# Altium footprint library DBLib.PcbLib: 99 footprints (part 5 of 7)
Each footprint in its own frame and in the unit in brackets; x right, y up, seen from the top. Pads: shape width x height; smd on the part's side, far side on the other; paste and mask are expansions set on the pad; w line width, h text height; cw(c..) or ccw(c..) is an arc to the next point about the centre after c.
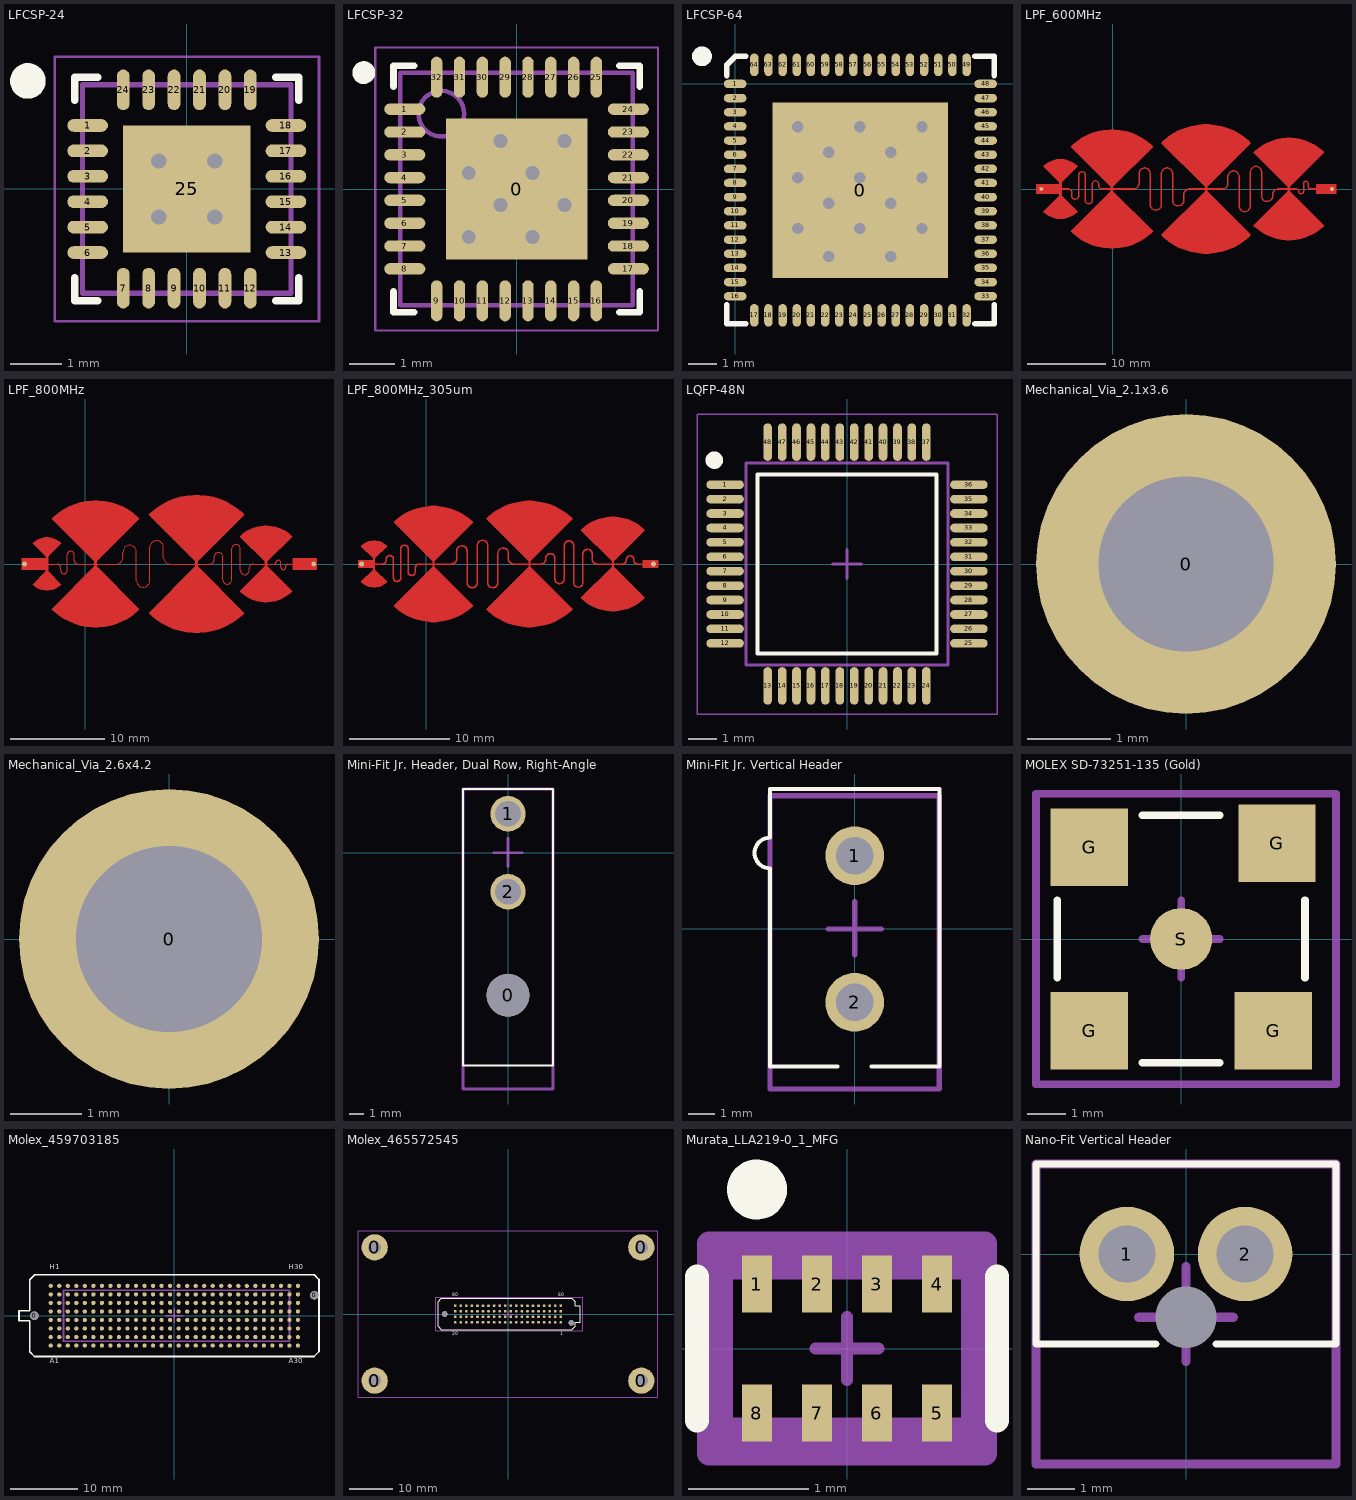
[diagram p4: the footprints below, top view; thin cyan lines are the x and y axes]

## LFCSP-24 [mm] "QFN, 24-Leads, Body 4,00x4,00mm, Pitch 0,50mm, Thermal Pad 2,50x2,50mm, IPC Medium Density"
height 0.8
pads (25):
  oval 0.8x0.25 smd: 1(-1.95,1.25) 2(-1.95,0.75) 3(-1.95,0.25) 4(-1.95,-0.25) 5(-1.95,-0.75) 6(-1.95,-1.25) 13(1.95,-1.25) 14(1.95,-0.75) 15(1.95,-0.25) 16(1.95,0.25) 17(1.95,0.75) 18(1.95,1.25)
  oval 0.25x0.8 smd: 7(-1.25,-1.95) 8(-0.75,-1.95) 9(-0.25,-1.95) 10(0.25,-1.95) 11(0.75,-1.95) 12(1.25,-1.95) 19(1.25,1.95) 20(0.75,1.95) 21(0.25,1.95) 22(-0.25,1.95) 23(-0.75,1.95) 24(-1.25,1.95)
  rect 2.5x2.5 all layers, no hole: 25(0,0)
via -0.55,-0.55 diameter 0.6 hole 0.3
via 0.55,-0.55 diameter 0.6 hole 0.3
via 0.55,0.55 diameter 0.6 hole 0.3
via -0.55,0.55 diameter 0.6 hole 0.3
Top Overlay:
  circle w0.35: c-3.125,2.125 r0.175
  lines w0.15: -2.2,-1.75 -2.2,-2.2 -1.75,-2.2 ; -2.2,1.75 -2.2,2.2 -1.75,2.2 ; 1.75,-2.2 2.2,-2.2 2.2,-1.75 ; 1.75,2.2 2.2,2.2 2.2,1.75
Mechanical 1:
  lines w0.05: -2.6,-2.6 2.6,-2.6 2.6,2.6 -2.6,2.6 -2.6,-2.6
  lines w0.1: -2.05,-2.05 2.05,-2.05 2.05,2.05 -2.05,2.05 -2.05,-2.05
Mechanical 15:
  lines w0.1: -0.5,0 0.5,0 ; 0,-0.5 0,0.5
3D body "User Library-LFCSP-24.step": height 0.83, standoff -0.02, extent -1.99,-2.01 2.01,1.99

## LFCSP-32 [mm] "LFCSP, 32-Leads, Body 5,00x5,00mm, Pitch 0,50mm"
height 1.35
pads (33):
  rect 3.1x3.1 all layers, no hole: 0(0,0)
  oval 0.9x0.25 smd: 1(-2.45,1.75) 2(-2.45,1.25) 3(-2.45,0.75) 4(-2.45,0.25) 5(-2.45,-0.25) 6(-2.45,-0.75) 7(-2.45,-1.25) 8(-2.45,-1.75) 17(2.45,-1.75) 18(2.45,-1.25) 19(2.45,-0.75) 20(2.45,-0.25) 21(2.45,0.25) 22(2.45,0.75) 23(2.45,1.25) 24(2.45,1.75)
  oval 0.25x0.9 smd: 9(-1.75,-2.45) 10(-1.25,-2.45) 11(-0.75,-2.45) 12(-0.25,-2.45) 13(0.25,-2.45) 14(0.75,-2.45) 15(1.25,-2.45) 16(1.75,-2.45) 25(1.75,2.45) 26(1.25,2.45) 27(0.75,2.45) 28(0.25,2.45) 29(-0.25,2.45) 30(-0.75,2.45) 31(-1.25,2.45) 32(-1.75,2.45)
via -1.05,-1.05 diameter 0.6 hole 0.3
via -0.35,1.05 diameter 0.6 hole 0.3
via 1.05,1.05 diameter 0.6 hole 0.3
via 0.35,0.35 diameter 0.6 hole 0.3
via -0.35,-0.35 diameter 0.6 hole 0.3
via 1.05,-0.35 diameter 0.6 hole 0.3
via 0.35,-1.05 diameter 0.6 hole 0.3
via -1.05,0.35 diameter 0.6 hole 0.3
Top Overlay:
  circle w0.25: c-3.35,2.55 r0.125
  lines w0.15: -2.7,-2.25 -2.7,-2.7 -2.25,-2.7 ; -2.7,2.25 -2.7,2.7 -2.25,2.7 ; 2.25,-2.7 2.7,-2.7 2.7,-2.25 ; 2.25,2.7 2.7,2.7 2.7,2.25
Mechanical 1:
  circle w0.1: c-1.65,1.65 r0.5
  lines w0.05: -3.1,-3.1 3.1,-3.1 3.1,3.1 -3.1,3.1 -3.1,-3.1
  lines w0.1: -0.5,0 0.5,0 ; 0,-0.5 0,0.5 ; -2.55,-2.55 2.55,-2.55 2.55,2.55 -2.55,2.55 -2.55,-2.55

## LFCSP-64 [mm]
height 1
pads (65):
  rect 6.2x6.2 all layers, no hole: 0(4.425,-3.75)
  oval 0.8x0.3 smd: 1(0,0) 2(0,-0.5) 3(0,-1) 4(0,-1.5) 5(0,-2) 6(0,-2.5) 7(0,-3) 8(0,-3.5) 9(0,-4) 10(0,-4.5) 11(0,-5) 12(0,-5.5) 13(0,-6) 14(0,-6.5) 15(0,-7) 16(0,-7.5) 33(8.85,-7.5) 34(8.85,-7) 35(8.85,-6.5) 36(8.85,-6) 37(8.85,-5.5) 38(8.85,-5) 39(8.85,-4.5) 40(8.85,-4) 41(8.85,-3.5) 42(8.85,-3) 43(8.85,-2.5) 44(8.85,-2) 45(8.85,-1.5) 46(8.85,-1) 47(8.85,-0.5) 48(8.85,0)
  oval 0.3x0.8 smd: 17(0.675,-8.175) 18(1.175,-8.175) 19(1.675,-8.175) 20(2.175,-8.175) 21(2.675,-8.175) 22(3.175,-8.175) 23(3.675,-8.175) 24(4.175,-8.175) 25(4.675,-8.175) 26(5.175,-8.175) 27(5.675,-8.175) 28(6.175,-8.175) 29(6.675,-8.175) 30(7.175,-8.175) 31(7.675,-8.175) 32(8.175,-8.175) 49(8.175,0.675) 50(7.675,0.675) 51(7.175,0.675) 52(6.675,0.675) 53(6.175,0.675) 54(5.675,0.675) 55(5.175,0.675) 56(4.675,0.675) 57(4.175,0.675) 58(3.675,0.675) 59(3.175,0.675) 60(2.675,0.675) 61(2.175,0.675) 62(1.675,0.675) 63(1.175,0.675) 64(0.675,0.675)
via 2.211,-5.111 diameter 0.7 hole 0.4
via 4.4,-1.511 diameter 0.7 hole 0.4
via 6.6,-1.511 diameter 0.7 hole 0.4
via 3.3,-2.411 diameter 0.7 hole 0.4
via 5.5,-2.411 diameter 0.7 hole 0.4
via 4.4,-3.311 diameter 0.7 hole 0.4
via 6.6,-3.311 diameter 0.7 hole 0.4
via 3.3,-4.211 diameter 0.7 hole 0.4
via 5.5,-4.211 diameter 0.7 hole 0.4
via 4.4,-5.111 diameter 0.7 hole 0.4
via 6.6,-5.111 diameter 0.7 hole 0.4
via 2.211,-3.311 diameter 0.7 hole 0.4
via 2.211,-1.511 diameter 0.7 hole 0.4
via 5.5,-6.1 diameter 0.7 hole 0.4
via 3.3,-6.1 diameter 0.7 hole 0.4
Top Overlay:
  circle w0.35: c-1.175,0.975 r0.175
  lines w0.2: -0.3,-7.8 -0.3,-8.475 0.375,-8.475 ; -0.3,0.3 -0.3,0.675 0,0.975 0.375,0.975 ; 8.475,-8.475 9.15,-8.475 9.15,-7.8 ; 8.475,0.975 9.15,0.975 9.15,0.3
Top Paste:
  rectangle: 4.6,-6.5 7.1,-3.9
  rectangle: 4.6,-3.6 7.1,-1
  rectangle: 1.7,-3.6 4.3,-1
  rectangle: 1.7,-6.5 4.3,-3.9
3D body "User Library-LFCSP-64 AD9984AKCPZ-170.step": height 0.82, standoff -0.05, extent -0.075,-8.25 8.925,0.75

## LPF_600MHz [mm] "stripline LPF"
pads (2):
  round 0.5 smd: IN(-9.144,0) OUT(27.94,0)
Top Layer:
  region: 25.93,-0.59 25.93,0.59 28.47,0.59 28.47,-0.59
  region: -9.826,-0.59 -6.826,-0.59 -6.826,0.59 -9.826,0.59
  region: 22.337,0.263 17.937,4.663 18.16,4.885 18.646,5.284 19.169,5.634 19.724,5.93 20.305,6.171 20.906,6.353 21.523,6.476 22.149,6.538 22.464,6.538 22.778,6.538 23.404,6.476 24.021,6.353 24.623,6.171 25.204,5.93 25.759,5.634 26.282,5.284 26.768,4.885 26.99,4.663 22.591,0.263
  region: 17.937,-4.663 18.16,-4.885 18.646,-5.284 19.169,-5.634 19.724,-5.93 20.305,-6.171 20.906,-6.353 21.523,-6.476 22.149,-6.538 22.464,-6.538 22.778,-6.538 23.404,-6.476 24.021,-6.353 24.623,-6.171 25.204,-5.93 25.759,-5.634 26.282,-5.284 26.768,-4.885 26.99,-4.663 22.591,-0.263 22.337,-0.263
  region: 6.151,-5.871 6.432,-6.152 7.048,-6.658 7.711,-7.1 8.414,-7.476 9.15,-7.781 9.912,-8.012 10.694,-8.168 11.487,-8.246 11.885,-8.246 12.283,-8.246 13.076,-8.168 13.858,-8.012 14.62,-7.781 15.356,-7.476 16.059,-7.1 16.721,-6.658 17.337,-6.152 17.619,-5.871 12.012,-0.263 11.758,-0.263
  region: 11.758,0.263 6.151,5.871 6.432,6.152 7.048,6.658 7.711,7.1 8.414,7.476 9.15,7.781 9.912,8.012 10.694,8.168 11.487,8.246 11.885,8.246 12.283,8.246 13.076,8.168 13.858,8.012 14.62,7.781 15.356,7.476 16.059,7.1 16.721,6.658 17.337,6.152 17.619,5.871 12.012,0.263
  region: -8.917,-2.882 -8.808,-2.991 -8.57,-3.187 -8.314,-3.358 -8.042,-3.503 -7.757,-3.621 -7.462,-3.711 -7.16,-3.771 -6.853,-3.801 -6.699,-3.801 -6.545,-3.801 -6.238,-3.771 -5.936,-3.711 -5.641,-3.621 -5.356,-3.503 -5.084,-3.358 -4.827,-3.187 -4.589,-2.991 -4.48,-2.882 -6.572,-0.79 -6.826,-0.79
  region: -6.826,0.79 -8.917,2.882 -8.808,2.991 -8.57,3.187 -8.314,3.358 -8.042,3.503 -7.757,3.621 -7.462,3.711 -7.16,3.771 -6.853,3.801 -6.699,3.801 -6.545,3.801 -6.238,3.771 -5.936,3.711 -5.641,3.621 -5.356,3.503 -5.084,3.358 -4.827,3.187 -4.589,2.991 -4.48,2.882 -6.572,0.79
  region: -5.395,-5.397 -5.136,-5.656 -4.571,-6.12 -3.963,-6.526 -3.319,-6.87 -2.643,-7.15 -1.944,-7.362 -1.227,-7.505 -0.499,-7.577 -0.134,-7.577 0.232,-7.577 0.959,-7.505 1.676,-7.362 2.376,-7.15 3.051,-6.87 3.696,-6.526 4.304,-6.12 4.869,-5.656 5.127,-5.397 -0.007,-0.263 -0.261,-0.263
  region: -0.261,0.263 -5.395,5.397 -5.136,5.656 -4.571,6.12 -3.963,6.526 -3.319,6.87 -2.643,7.15 -1.944,7.362 -1.227,7.505 -0.499,7.577 -0.134,7.577 0.232,7.577 0.959,7.505 1.676,7.362 2.376,7.15 3.051,6.87 3.696,6.526 4.304,6.12 4.869,5.656 5.127,5.397 -0.007,0.263
  region: 22.337,-0.27 22.335,-0.27 22.333,-0.269 22.331,-0.267 22.33,-0.265 22.33,-0.263 22.33,0.263 22.33,0.265 22.331,0.267 22.333,0.269 22.335,0.27 22.337,0.27 22.591,0.27 22.592,0.27 22.595,0.269 22.596,0.267 22.597,0.265 22.597,0.263 22.597,-0.263 22.597,-0.265 22.596,-0.267 22.595,-0.269 22.592,-0.27 22.591,-0.27
  region: -6.826,-0.797 -6.827,-0.797 -6.83,-0.796 -6.831,-0.794 -6.833,-0.792 -6.833,-0.79 -6.833,0.79 -6.833,0.792 -6.831,0.794 -6.83,0.796 -6.827,0.797 -6.826,0.797 -6.572,0.797 -6.57,0.797 -6.568,0.796 -6.566,0.794 -6.565,0.792 -6.565,0.79 -6.565,-0.79 -6.565,-0.792 -6.566,-0.794 -6.568,-0.796 -6.57,-0.797 -6.572,-0.797
  region: -0.261,-0.27 -0.262,-0.27 -0.265,-0.269 -0.266,-0.267 -0.267,-0.265 -0.267,-0.263 -0.267,0.263 -0.267,0.265 -0.266,0.267 -0.265,0.269 -0.262,0.27 -0.261,0.27 -0.007,0.27 -0.005,0.27 -0.003,0.269 -0.001,0.267 0,0.265 0,0.263 0,-0.263 0,-0.265 -0.001,-0.267 -0.003,-0.269 -0.005,-0.27 -0.007,-0.27
  region: 11.758,-0.27 11.757,-0.27 11.754,-0.269 11.752,-0.267 11.751,-0.265 11.751,-0.263 11.751,0.263 11.751,0.265 11.752,0.267 11.754,0.269 11.757,0.27 11.758,0.27 12.012,0.27 12.013,0.27 12.016,0.269 12.018,0.267 12.019,0.265 12.019,0.263 12.019,-0.263 12.019,-0.265 12.018,-0.267 12.016,-0.269 12.013,-0.27 12.012,-0.27
  region: 191 vertices and 0 holes, not listed, extent -0.064,-2.757 11.815,2.757
  region: 191 vertices and 0 holes, not listed, extent 11.955,-2.954 22.394,2.954
  region: 151 vertices and 0 holes, not listed, extent -6.629,-1.964 -0.204,2.262
  region: 24.009,-0.677 23.934,-0.677 23.795,-0.62 23.689,-0.514 23.631,-0.375 23.631,-0.3 23.627,-0.254 23.592,-0.169 23.526,-0.104 23.441,-0.068 23.395,-0.064 22.597,-0.064 22.571,-0.064 22.534,-0.026 22.534,0.026 22.571,0.064 22.597,0.064 23.395,0.064 23.468,0.064 23.601,0.009 23.704,-0.094 23.759,-0.228 23.759,-0.3 23.764,-0.349 23.801,-0.439 23.87,-0.507 23.96,-0.545 24.009,-0.549 24.057,-0.545 24.147,-0.507 24.216,-0.439 24.254,-0.349 24.258,-0.3 24.258,0.658 24.258,0.733 24.316,0.871 24.422,0.978 24.561,1.035 24.636,1.035 24.711,1.035 24.849,0.978 24.956,0.871 25.013,0.733 25.013,0.658 25.013,0.313 25.018,0.265 25.055,0.175 25.124,0.106 25.214,0.069 25.263,0.064 25.93,0.064 25.942,0.064 25.966,0.054 25.984,0.036 25.994,0.013 25.994,0 25.994,-0.013 25.984,-0.036 25.966,-0.054 25.942,-0.064 25.93,-0.064 25.263,-0.064 25.188,-0.064 25.049,-0.006 24.943,0.1 24.885,0.238 24.885,0.313 24.885,0.658 24.881,0.706 24.843,0.796 24.774,0.865 24.684,0.903 24.636,0.907 24.587,0.903 24.497,0.865 24.428,0.796 24.391,0.706 24.386,0.658 24.386,-0.3 24.386,-0.375 24.329,-0.514 24.222,-0.62 24.084,-0.677
Top Solder:
  region: -8.89,8.89 27.305,8.89 27.431,8.89 27.665,8.793 27.843,8.615 27.94,8.381 27.94,8.255 27.94,-8.255 27.94,-8.381 27.843,-8.615 27.665,-8.793 27.431,-8.89 27.305,-8.89 -8.89,-8.89 -9.016,-8.89 -9.25,-8.793 -9.428,-8.615 -9.525,-8.381 -9.525,-8.255 -9.525,8.255 -9.525,8.381 -9.428,8.615 -9.25,8.793 -9.016,8.89

## LPF_800MHz [mm] "stripline LPF"
pads (2):
  round 0.5 smd: IN(-6.4,0) OUT(24.2,0)
Top Layer:
  region: 0.995,0.268 -3.524,4.787 -3.296,5.015 -2.797,5.425 -2.26,5.783 -1.691,6.088 -1.094,6.335 -0.476,6.522 0.157,6.648 0.799,6.711 1.122,6.711 1.445,6.711 2.087,6.648 2.72,6.522 3.338,6.335 3.934,6.088 4.504,5.783 5.04,5.425 5.539,5.015 5.767,4.787 1.249,0.268
  region: -5.543,-2.17 -5.394,-2.319 -5.044,-2.552 -4.655,-2.714 -4.242,-2.796 -4.032,-2.796 -3.822,-2.796 -3.409,-2.714 -3.02,-2.552 -2.67,-2.319 -2.521,-2.17 -3.905,-0.786 -4.159,-0.786
  region: -4.159,0.795 -5.543,2.18 -5.394,2.328 -5.044,2.562 -4.655,2.723 -4.242,2.806 -4.032,2.806 -3.822,2.806 -3.409,2.723 -3.02,2.562 -2.67,2.328 -2.521,2.18 -3.905,0.795
  region: -4.159,-0.786 -3.905,-0.786 -3.905,0.795 -4.159,0.795
  region: -6.699,-0.586 -6.699,0.595 -4.159,0.595 -4.159,-0.586
  region: 0.995,-0.259 0.995,0.268 1.249,0.268 1.249,-0.259
  region: -3.524,-4.777 -3.296,-5.005 -2.797,-5.415 -2.26,-5.774 -1.691,-6.078 -1.094,-6.325 -0.476,-6.512 0.157,-6.638 0.799,-6.702 1.122,-6.702 1.445,-6.702 2.087,-6.638 2.72,-6.512 3.338,-6.325 3.934,-6.078 4.504,-5.774 5.04,-5.415 5.539,-5.005 5.767,-4.777 1.249,-0.259 0.995,-0.259
  region: 6.756,5.203 11.69,0.268 11.944,0.268 16.879,5.203 16.63,5.452 16.086,5.898 15.502,6.288 14.881,6.62 14.232,6.889 13.559,7.093 12.869,7.23 12.169,7.299 11.817,7.299 11.466,7.299 10.766,7.23 10.076,7.093 9.403,6.889 8.753,6.62 8.133,6.288 7.548,5.898 7.004,5.452
  region: 11.69,-0.259 11.944,-0.259 11.944,0.268 11.69,0.268
  region: 6.756,-5.193 7.004,-5.442 7.548,-5.888 8.133,-6.279 8.753,-6.61 9.403,-6.879 10.076,-7.083 10.766,-7.221 11.466,-7.29 11.817,-7.29 12.169,-7.29 12.869,-7.221 13.559,-7.083 14.232,-6.879 14.881,-6.61 15.502,-6.279 16.086,-5.888 16.63,-5.442 16.879,-5.193 11.944,-0.259 11.69,-0.259
  region: 16.393,2.906 19.03,0.268 19.284,0.268 21.922,2.906 21.786,3.042 21.489,3.286 21.17,3.499 20.831,3.68 20.476,3.827 20.109,3.939 19.732,4.014 19.349,4.051 19.157,4.051 18.965,4.051 18.583,4.014 18.206,3.939 17.839,3.827 17.484,3.68 17.145,3.499 16.825,3.286 16.528,3.042
  region: 19.03,-0.259 19.284,-0.259 19.284,0.268 19.03,0.268
  region: 16.393,-2.896 16.528,-3.032 16.825,-3.276 17.145,-3.489 17.484,-3.67 17.839,-3.818 18.206,-3.929 18.583,-4.004 18.965,-4.042 19.157,-4.042 19.349,-4.042 19.732,-4.004 20.109,-3.929 20.476,-3.818 20.831,-3.67 21.17,-3.489 21.489,-3.276 21.786,-3.032 21.922,-2.896 19.284,-0.259 19.03,-0.259
  region: 21.992,-0.586 24.532,-0.586 24.532,0.595 21.992,0.595
  lines w0.013: -3.905,-0.059 -3.905,0.068 ; 0.995,-0.059 0.995,0.068 ; 1.249,-0.059 1.249,0.068 ; 11.69,-0.059 11.69,0.068 ; 11.944,-0.059 11.944,0.068
  lines w0.127: -3.912,0 -3.683,0 -3.32,0 -2.956,0 cw(c-2.956,-0.363) -2.593,-0.363 -2.593,-0.674 ccw(c-2.229,-0.674) -2.229,-1.038 ccw(c-2.229,-0.674) -1.866,-0.674 -1.866,0 -1.866,0.978 cw(c-1.502,0.978) -1.502,1.342 cw(c-1.502,0.978) -1.139,0.978 -1.139,0.363 ccw(c-0.775,0.363) -0.775,0 0,0 0.991,0 ; 1.245,0 3.302,0 ccw(c3.302,0.713) 4.015,0.713 4.015,1.254 cw(c4.729,1.254) 4.729,1.968 cw(c4.729,1.254) 5.442,1.254 5.442,0 5.442,-1.749 ccw(c6.156,-1.749) 6.156,-2.462 ccw(c6.156,-1.749) 6.869,-1.749 6.869,0 6.869,1.749 cw(c7.583,1.749) 7.583,2.462 cw(c7.583,1.749) 8.296,1.749 8.296,0.713 ccw(c9.01,0.713) 9.01,0 10.287,0 11.69,0 ; 11.944,0 13.208,0 ccw(c13.208,0.463) 13.671,0.463 13.671,0.743 cw(c14.135,0.743) 14.135,1.206 cw(c14.135,0.743) 14.598,0.743 14.598,0 14.598,-1.66 ccw(c15.062,-1.66) 15.062,-2.123 ccw(c15.062,-1.66) 15.525,-1.66 15.525,0 15.525,1.593 cw(c15.989,1.593) 15.989,2.057 cw(c15.989,1.593) 16.452,1.593 16.452,0 16.452,-0.657 ccw(c16.916,-0.657) 16.916,-1.12 ccw(c16.916,-0.657) 17.379,-0.657 17.379,-0.463 cw(c17.843,-0.463) 17.843,0 18.288,0 19.03,0 ; 19.284,0 19.939,0 20.072,0 ccw(c20.072,0.13) 20.202,0.13 cw(c20.466,0.13) 20.466,0.394 cw(c20.466,0.13) 20.729,0.13 20.729,0 20.729,-0.337 ccw(c20.993,-0.337) 20.993,-0.601 ccw(c20.993,-0.337) 21.256,-0.337 21.256,-0.263 cw(c21.52,-0.263) 21.52,0 21.692,0 21.996,0
Top Solder:
  region: -6.35,8.255 24.13,8.255 24.256,8.255 24.49,8.158 24.668,7.98 24.765,7.746 24.765,7.62 24.765,-7.62 24.765,-7.746 24.668,-7.98 24.49,-8.158 24.256,-8.255 24.13,-8.255 -6.35,-8.255 -6.476,-8.255 -6.71,-8.158 -6.888,-7.98 -6.985,-7.746 -6.985,-7.62 -6.985,7.62 -6.985,7.746 -6.888,7.98 -6.71,8.158 -6.476,8.255

## LPF_800MHz_305um [mm] "stripline LPF"
pads (2):
  round 0.5 smd: IN(-6.4,0) OUT(22.606,0)
Top Layer:
  region: 21.528,-0.355 21.528,0.355 23.053,0.355 23.053,-0.355
  region: 15.379,3.369 18.486,0.262 18.638,0.262 21.745,3.369 21.588,3.525 21.247,3.806 20.879,4.052 20.489,4.26 20.08,4.429 19.657,4.558 19.223,4.644 18.783,4.687 18.562,4.687 18.341,4.687 17.901,4.644 17.467,4.558 17.044,4.429 16.635,4.26 16.245,4.052 15.878,3.806 15.536,3.525
  region: 15.379,-3.369 15.536,-3.525 15.878,-3.806 16.245,-4.052 16.635,-4.26 17.044,-4.429 17.467,-4.558 17.901,-4.644 18.341,-4.687 18.562,-4.687 18.783,-4.687 19.223,-4.644 19.657,-4.558 20.08,-4.429 20.489,-4.26 20.879,-4.052 21.247,-3.806 21.588,-3.525 21.745,-3.369 18.638,-0.262 18.486,-0.262
  region: 18.486,-0.262 18.486,0.262 18.638,0.262 18.638,-0.262
  region: 5.977,-4.487 6.188,-4.698 6.65,-5.077 7.147,-5.409 7.674,-5.691 8.226,-5.92 8.798,-6.093 9.384,-6.21 9.979,-6.268 10.278,-6.268 10.576,-6.268 11.171,-6.21 11.757,-6.093 12.329,-5.92 12.881,-5.691 13.408,-5.409 13.905,-5.077 14.367,-4.698 14.578,-4.487 10.354,-0.262 10.201,-0.262
  region: 5.977,4.487 10.201,0.262 10.354,0.262 14.578,4.487 14.367,4.698 13.905,5.077 13.408,5.409 12.881,5.691 12.329,5.92 11.757,6.093 11.171,6.21 10.576,6.268 10.278,6.268 9.979,6.268 9.384,6.21 8.798,6.093 8.226,5.92 7.674,5.691 7.147,5.409 6.65,5.077 6.188,4.698
  region: 10.201,-0.262 10.354,-0.262 10.354,0.262 10.201,0.262
  region: 0.658,0.262 -3.212,4.133 -3.018,4.326 -2.594,4.674 -2.138,4.979 -1.655,5.237 -1.148,5.447 -0.623,5.607 -0.086,5.714 0.46,5.767 0.734,5.767 1.008,5.767 1.554,5.714 2.092,5.607 2.617,5.447 3.123,5.237 3.607,4.979 4.063,4.674 4.487,4.326 4.681,4.133 0.811,0.262
  region: -3.212,-4.133 -3.018,-4.326 -2.594,-4.674 -2.138,-4.979 -1.655,-5.237 -1.148,-5.447 -0.623,-5.607 -0.086,-5.714 0.46,-5.767 0.734,-5.767 1.008,-5.767 1.554,-5.714 2.092,-5.607 2.617,-5.447 3.123,-5.237 3.607,-4.979 4.063,-4.674 4.487,-4.326 4.681,-4.133 0.811,-0.262 0.658,-0.262
  region: 0.658,-0.262 0.658,0.262 0.811,0.262 0.811,-0.262
  region: -6.459,-1.782 -6.331,-1.911 -6.029,-2.112 -5.694,-2.251 -5.338,-2.322 -5.156,-2.322 -4.975,-2.322 -4.619,-2.251 -4.283,-2.112 -3.981,-1.911 -3.853,-1.782 -5.08,-0.555 -5.232,-0.555
  region: -5.232,0.555 -6.459,1.782 -6.331,1.911 -6.029,2.112 -5.694,2.251 -5.338,2.322 -5.156,2.322 -4.975,2.322 -4.619,2.251 -4.283,2.112 -3.981,1.911 -3.853,1.782 -5.08,0.555
  region: -5.232,-0.562 -5.234,-0.562 -5.236,-0.561 -5.238,-0.559 -5.239,-0.557 -5.239,-0.555 -5.239,0.555 -5.239,0.557 -5.238,0.559 -5.236,0.561 -5.234,0.562 -5.232,0.562 -5.08,0.562 -5.079,0.562 -5.076,0.561 -5.074,0.559 -5.073,0.557 -5.073,0.555 -5.073,-0.555 -5.073,-0.557 -5.074,-0.559 -5.076,-0.561 -5.079,-0.562 -5.08,-0.562
  region: -6.757,-0.355 -5.232,-0.355 -5.232,0.355 -6.757,0.355
  lines w0.125: -5.08,0 -4.318,0 ccw(c-4.318,0.362) -3.956,0.362 -3.956,0.486 cw(c-3.593,0.486) -3.593,0.848 ; 0.658,0 0,0 -0.693,0 ccw(c-0.693,-0.362) -1.056,-0.362 -1.056,-0.782 cw(c-1.418,-0.782) -1.418,-1.145 ; 0.811,0 2.54,0 ccw(c2.54,0.512) 3.052,0.512 3.052,1.299 cw(c3.565,1.299) 3.565,1.812 ; 10.201,0 9.652,0 8.69,0 cw(c8.69,0.513) 8.177,0.513 8.177,1.081 ccw(c7.665,1.081) 7.665,1.594 ; 10.354,0 11.43,0 ccw(c11.43,0.462) 11.892,0.462 11.892,0.57 cw(c12.355,0.57) 12.355,1.033 ; 18.486,0 17.78,0 16.98,0 cw(c16.98,0.462) 16.517,0.462 16.517,1 ccw(c16.055,1) 16.055,1.462 ; 18.638,0 19.558,0 ccw(c19.558,0.362) 19.92,0.362 19.92,0.449 cw(c20.283,0.449) 20.283,0.811 ; 21.528,0 21.336,0 21.008,0 cw(c21.008,0.362) 20.645,0.362 20.645,0.449 ccw(c20.283,0.449) 20.283,0.811 ; -3.593,0.848 cw(c-3.593,0.486) -3.231,0.486 -3.231,0 -3.231,-1.379 ccw(c-2.868,-1.379) -2.868,-1.741 ; -3.593,0.848 -3.593,0.848 ; -3.593,0.848 -3.593,0.848 ; -2.868,-1.741 ccw(c-2.868,-1.379) -2.506,-1.379 -2.506,0 -2.506,1.507 cw(c-2.143,1.507) -2.143,1.87 ; -2.868,-1.741 -2.868,-1.741 ; -2.868,-1.741 -2.868,-1.741 ; -2.143,1.87 cw(c-2.143,1.507) -1.781,1.507 -1.781,0 -1.781,-0.782 ccw(c-1.418,-0.782) -1.418,-1.145 ; -2.143,1.87 -2.143,1.87 ; -2.143,1.87 -2.143,1.87 ; -1.418,-1.145 -1.418,-1.145 ; -1.418,-1.145 -1.418,-1.145 ; 3.565,1.812 cw(c3.565,1.299) 4.077,1.299 4.077,0 4.077,-1.84 ccw(c4.59,-1.84) 4.59,-2.353 ; 3.565,1.812 3.565,1.812 ; 3.565,1.812 3.565,1.812 ; 4.59,-2.353 ccw(c4.59,-1.84) 5.102,-1.84 5.102,0 5.102,1.84 cw(c5.615,1.84) 5.615,2.353 ; 4.59,-2.353 4.59,-2.353 ; 4.59,-2.353 4.59,-2.353 ; 5.615,2.353 cw(c5.615,1.84) 6.127,1.84 6.127,0 6.127,-1.84 ccw(c6.64,-1.84) 6.64,-2.353 ; 5.615,2.353 5.615,2.353 ; 5.615,2.353 5.615,2.353 ; 6.64,-2.353 ccw(c6.64,-1.84) 7.152,-1.84 7.152,0 7.152,1.081 cw(c7.665,1.081) 7.665,1.594 ; 6.64,-2.353 6.64,-2.353 ; 6.64,-2.353 6.64,-2.353 ; 7.665,1.594 7.665,1.594 ; 7.665,1.594 7.665,1.594 ; 12.355,1.033 cw(c12.355,0.57) 12.817,0.57 12.817,0 12.817,-1.495 ccw(c13.28,-1.495) 13.28,-1.958 ; 12.355,1.033 12.355,1.033 ; 12.355,1.033 12.355,1.033 ; 13.28,-1.958 ccw(c13.28,-1.495) 13.742,-1.495 13.742,0 13.742,1.844 cw(c14.205,1.844) 14.205,2.306 ; 13.28,-1.958 13.28,-1.958 ; 13.28,-1.958 13.28,-1.958 ; 14.205,2.306 cw(c14.205,1.844) 14.667,1.844 14.667,0 14.667,-1.844 ccw(c15.13,-1.844) 15.13,-2.306 ; 14.205,2.306 14.205,2.306 ; 14.205,2.306 14.205,2.306 ; 15.13,-2.306 ccw(c15.13,-1.844) 15.592,-1.844 15.592,0 15.592,1 cw(c16.055,1) 16.055,1.462 ; 15.13,-2.306 15.13,-2.306 ; 15.13,-2.306 15.13,-2.306 ; 16.055,1.462 16.055,1.462 ; 16.055,1.462 16.055,1.462 ; 20.283,0.811 20.283,0.811 ; 20.283,0.811 20.283,0.811

## LQFP-48N [mm] "TSQFP, 48-Leads, Body 7,00x7,00mm, Pitch 0,50mm, IPC Medium Density"
height 1.6
pads (48):
  oval 1.3x0.3 smd: 1(-4.225,2.75) 2(-4.225,2.25) 3(-4.225,1.75) 4(-4.225,1.25) 5(-4.225,0.75) 6(-4.225,0.25) 7(-4.225,-0.25) 8(-4.225,-0.75) 9(-4.225,-1.25) 10(-4.225,-1.75) 11(-4.225,-2.25) 12(-4.225,-2.75) 25(4.225,-2.75) 26(4.225,-2.25) 27(4.225,-1.75) 28(4.225,-1.25) 29(4.225,-0.75) 30(4.225,-0.25) 31(4.225,0.25) 32(4.225,0.75) 33(4.225,1.25) 34(4.225,1.75) 35(4.225,2.25) 36(4.225,2.75)
  oval 0.3x1.3 smd: 13(-2.75,-4.225) 14(-2.25,-4.225) 15(-1.75,-4.225) 16(-1.25,-4.225) 17(-0.75,-4.225) 18(-0.25,-4.225) 19(0.25,-4.225) 20(0.75,-4.225) 21(1.25,-4.225) 22(1.75,-4.225) 23(2.25,-4.225) 24(2.75,-4.225) 37(2.75,4.225) 38(2.25,4.225) 39(1.75,4.225) 40(1.25,4.225) 41(0.75,4.225) 42(0.25,4.225) 43(-0.25,4.225) 44(-0.75,4.225) 45(-1.25,4.225) 46(-1.75,4.225) 47(-2.25,4.225) 48(-2.75,4.225)
Top Overlay:
  circle w0.35: c-4.6,3.6 r0.127
  lines w0.15: -3.1,-3.1 3.1,-3.1 3.1,3.1 -3.1,3.1 -3.1,-3.1
Mechanical 1:
  lines w0.05: -5.2,-5.2 5.2,-5.2 5.2,5.2 -5.2,5.2 -5.2,-5.2
  lines w0.1: -0.5,0 0.5,0 ; 0,-0.5 0,0.5 ; -3.5,-3.5 3.5,-3.5 3.5,3.5 -3.5,3.5 -3.5,-3.5
3D body "User Library-LQFP50P900X900X160.STEP": height 1.6, standoff 0, extent -4.5,-4.5 4.5,4.5

## Mechanical_Via_2.1x3.6 [mm] "Mechanical_Via"
pads (1):
  round 3.6 hole 2.1: 0(0,0)

## Mechanical_Via_2.6x4.2 [mm] "Mechanical_Via"
pads (1):
  round 4.2 hole 2.6: 0(0,0)

## Mini-Fit Jr. Header, Dual Row, Right-Angle [mm] "Mini-Fit Jr. Header, Dual Row, Right-Angle"
height 9.6
pads (3):
  round 3 hole 3 unplated: 0(0,-10.05)
  round 2.5 hole 1.8: 1(0,2.75) 2(0,-2.75)
Top Overlay:
  lines w0.15: -3.175,-15 -3.175,4.5 3.175,4.5 3.175,-15 -3.175,-15
Mechanical 1:
  lines w0.2: -1,0 1,0 ; 0,-0.97 0,1.03 ; -3.175,-16.668 3.175,-16.668 3.175,4.5 -3.175,4.5 -3.175,-16.668
3D body "026013114.stp": height 11.48, standoff -3.52, extent -2.7,-16.668 3.1,3.267

## Mini-Fit Jr. Vertical Header [mm] "4.20mm Pitch, Dual Row"
height 12.8
pads (2):
  round 2.2 hole 1.4: 1(0,2.75) 2(0,-2.75)
Top Overlay:
  lines w0.15: -0.635,-5.155 -3.175,-5.155 -3.175,2.275 cw(c-3.175,2.85) -3.175,3.425 -3.175,5.25 3.175,5.25 3.175,-5.155 0.635,-5.155
Mechanical 1:
  lines w0.2: -1,0 1,0 ; 0,-0.97 0,1.03 ; -3.175,-6 -3.175,5 3.175,5 3.175,-6 -3.175,-6
3D body "039281023.stp": height 12.88, standoff -3.42, extent -3.1,-5.95 3.1,5.05

## MOLEX SD-73251-135 (Gold) [mm]
pads (5):
  rect 2x2 smd: G(-2.375,-2.375) G(-2.375,2.375) G(2.375,-2.375) G(2.475,2.475)
  round 1.6 smd: S(0,0)
Top Overlay:
  lines w0.2: -3.2,-1 -3.2,1 ; -1,-3.2 1,-3.2 ; -1,3.2 1,3.2 ; 3.2,-1 3.2,1
Mechanical 1:
  lines w0.2: -1,0 1,0 ; 0,-1 0,1 ; -3.75,-3.75 4,-3.75 4,3.75 -3.75,3.75 -3.75,-3.75
3D body "MOLEX SD-73251-135 Gold.stp": height 9.52, standoff -0.11, extent -3.175,-3.175 3.175,3.175

## Molex_459703185 [mm] "SEARAY Plug, 240 Circuits, 2.00mm Unmated Height, 8 Rows"
height 2
pads (242):
  round 1.27 hole 1.27 unplated: 0(-20.845,0) 0(20.845,3.05)
  round 0.635 smd: A1(-18.415,-4.445) A2(-17.145,-4.445) A3(-15.875,-4.445) A4(-14.605,-4.445) A5(-13.335,-4.445) A6(-12.065,-4.445) A7(-10.795,-4.445) A8(-9.525,-4.445) A9(-8.255,-4.445) A10(-6.985,-4.445) A11(-5.715,-4.445) A12(-4.445,-4.445) A13(-3.175,-4.445) A14(-1.905,-4.445) A15(-0.635,-4.445) A16(0.635,-4.445) A17(1.905,-4.445) A18(3.175,-4.445) A19(4.445,-4.445) A20(5.715,-4.445) A21(6.985,-4.445) A22(8.255,-4.445) A23(9.525,-4.445) A24(10.795,-4.445) A25(12.065,-4.445) A26(13.335,-4.445) A27(14.605,-4.445) A28(15.875,-4.445) A29(17.145,-4.445) A30(18.415,-4.445) B1(-18.415,-3.175) B2(-17.145,-3.175) B3(-15.875,-3.175) B4(-14.605,-3.175) B5(-13.335,-3.175) B6(-12.065,-3.175) B7(-10.795,-3.175) B8(-9.525,-3.175) B9(-8.255,-3.175) B10(-6.985,-3.175) B11(-5.715,-3.175) B12(-4.445,-3.175) B13(-3.175,-3.175) B14(-1.905,-3.175) B15(-0.635,-3.175) B16(0.635,-3.175) B17(1.905,-3.175) B18(3.175,-3.175) B19(4.445,-3.175) B20(5.715,-3.175) B21(6.985,-3.175) B22(8.255,-3.175) B23(9.525,-3.175) B24(10.795,-3.175) B25(12.065,-3.175) B26(13.335,-3.175) B27(14.605,-3.175) B28(15.875,-3.175) B29(17.145,-3.175) B30(18.415,-3.175) C1(-18.415,-1.905) C2(-17.145,-1.905) C3(-15.875,-1.905) C4(-14.605,-1.905) C5(-13.335,-1.905) C6(-12.065,-1.905) C7(-10.795,-1.905) C8(-9.525,-1.905) C9(-8.255,-1.905) C10(-6.985,-1.905) C11(-5.715,-1.905) C12(-4.445,-1.905) C13(-3.175,-1.905) C14(-1.905,-1.905) C15(-0.635,-1.905) C16(0.635,-1.905) C17(1.905,-1.905) C18(3.175,-1.905) C19(4.445,-1.905) C20(5.715,-1.905) C21(6.985,-1.905) C22(8.255,-1.905) C23(9.525,-1.905) C24(10.795,-1.905) C25(12.065,-1.905) C26(13.335,-1.905) C27(14.605,-1.905) C28(15.875,-1.905) C29(17.145,-1.905) C30(18.415,-1.905) D1(-18.415,-0.635) D2(-17.145,-0.635) D3(-15.875,-0.635) D4(-14.605,-0.635) D5(-13.335,-0.635) D6(-12.065,-0.635) D7(-10.795,-0.635) D8(-9.525,-0.635) D9(-8.255,-0.635) D10(-6.985,-0.635) D11(-5.715,-0.635) D12(-4.445,-0.635) D13(-3.175,-0.635) D14(-1.905,-0.635) D15(-0.635,-0.635) D16(0.635,-0.635) D17(1.905,-0.635) D18(3.175,-0.635) D19(4.445,-0.635) D20(5.715,-0.635) D21(6.985,-0.635) D22(8.255,-0.635) D23(9.525,-0.635) D24(10.795,-0.635) D25(12.065,-0.635) D26(13.335,-0.635) D27(14.605,-0.635) D28(15.875,-0.635) D29(17.145,-0.635) D30(18.415,-0.635) E1(-18.415,0.635) E2(-17.145,0.635) E3(-15.875,0.635) E4(-14.605,0.635) E5(-13.335,0.635) E6(-12.065,0.635) E7(-10.795,0.635) E8(-9.525,0.635) E9(-8.255,0.635) E10(-6.985,0.635) E11(-5.715,0.635) E12(-4.445,0.635) E13(-3.175,0.635) E14(-1.905,0.635) E15(-0.635,0.635) E16(0.635,0.635) E17(1.905,0.635) E18(3.175,0.635) E19(4.445,0.635) E20(5.715,0.635) E21(6.985,0.635) E22(8.255,0.635) E23(9.525,0.635) E24(10.795,0.635) E25(12.065,0.635) E26(13.335,0.635) E27(14.605,0.635) E28(15.875,0.635) E29(17.145,0.635) E30(18.415,0.635) F1(-18.415,1.905) F2(-17.145,1.905) F3(-15.875,1.905) F4(-14.605,1.905) F5(-13.335,1.905) F6(-12.065,1.905) F7(-10.795,1.905) F8(-9.525,1.905) F9(-8.255,1.905) F10(-6.985,1.905) F11(-5.715,1.905) F12(-4.445,1.905) F13(-3.175,1.905) F14(-1.905,1.905) F15(-0.635,1.905) F16(0.635,1.905) F17(1.905,1.905) F18(3.175,1.905) F19(4.445,1.905) F20(5.715,1.905) F21(6.985,1.905) F22(8.255,1.905) F23(9.525,1.905) F24(10.795,1.905) F25(12.065,1.905) F26(13.335,1.905) F27(14.605,1.905) F28(15.875,1.905) F29(17.145,1.905) F30(18.415,1.905) G1(-18.415,3.175) G2(-17.145,3.175) G3(-15.875,3.175) G4(-14.605,3.175) G5(-13.335,3.175) G6(-12.065,3.175) G7(-10.795,3.175) G8(-9.525,3.175) G9(-8.255,3.175) G10(-6.985,3.175) G11(-5.715,3.175) G12(-4.445,3.175) G13(-3.175,3.175) G14(-1.905,3.175) G15(-0.635,3.175) G16(0.635,3.175) G17(1.905,3.175) G18(3.175,3.175) G19(4.445,3.175) G20(5.715,3.175) G21(6.985,3.175) G22(8.255,3.175) G23(9.525,3.175) G24(10.795,3.175) G25(12.065,3.175) G26(13.335,3.175) G27(14.605,3.175) G28(15.875,3.175) G29(17.145,3.175) G30(18.415,3.175) H1(-18.415,4.445) H2(-17.145,4.445) H3(-15.875,4.445) H4(-14.605,4.445) H5(-13.335,4.445) H6(-12.065,4.445) H7(-10.795,4.445) H8(-9.525,4.445) H9(-8.255,4.445) H10(-6.985,4.445) H11(-5.715,4.445) H12(-4.445,4.445) H13(-3.175,4.445) H14(-1.905,4.445) H15(-0.635,4.445) H16(0.635,4.445) H17(1.905,4.445) H18(3.175,4.445) H19(4.445,4.445) H20(5.715,4.445) H21(6.985,4.445) H22(8.255,4.445) H23(9.525,4.445) H24(10.795,4.445) H25(12.065,4.445) H26(13.335,4.445) H27(14.605,4.445) H28(15.875,4.445) H29(17.145,4.445) H30(18.415,4.445)
Top Overlay:
  lines w0.254: -23.145,-0.76 -23.145,0.76 -21.545,0.76 -21.545,5.335 -20.8,6.08 20.844,6.08 21.545,5.379 21.545,-5.334 20.799,-6.08 -20.844,-6.08 -21.545,-5.379 -21.545,-0.76 -23.145,-0.76
  text "A30" at 17.018,-7.366 h1.27
  text "A1" at -18.542,-7.366 h1.27
  text "H30" at 17.018,6.604 h1.27
  text "H1" at -18.542,6.604 h1.27
Mechanical 1:
  lines w0.254: -1.016,0 1.016,0 ; 0,-0.762 0,0.762
Mechanical 15:
  lines w0.254: 0,-1.016 0,1.016 ; 0,-0.635 0,0.635 ; 0.635,0 1.27,0 ; 1.27,0 -1.27,0 1.27,0 ; -16.51,-3.81 -16.51,3.81 17.145,3.81 17.145,-3.81 -16.51,-3.81
3D body "459703185.stp": height 5.68, standoff -1.21, extent -23.127,-6.071 21.552,6.071

## Molex_465572545 [mm] "CONN FML 80POS 4ROWS GOLD"
height 8
pads (86):
  round 6 hole 3: 0(-30.48,-15.24) 0(-30.48,15.24) 0(30.48,-15.24) 0(30.48,15.24)
  round 1.27 hole 1.27 unplated: 0(-14.495,0) 0(14.495,-2.01)
  round 0.64 smd: 1(12.065,-1.905) 2(10.795,-1.905) 3(9.525,-1.905) 4(8.255,-1.905) 5(6.985,-1.905) 6(5.715,-1.905) 7(4.445,-1.905) 8(3.175,-1.905) 9(1.905,-1.905) 10(0.635,-1.905) 11(-0.635,-1.905) 12(-1.905,-1.905) 13(-3.175,-1.905) 14(-4.445,-1.905) 15(-5.715,-1.905) 16(-6.985,-1.905) 17(-8.255,-1.905) 18(-9.525,-1.905) 19(-10.795,-1.905) 20(-12.065,-1.905) 21(12.065,-0.635) 22(10.795,-0.635) 23(9.525,-0.635) 24(8.255,-0.635) 25(6.985,-0.635) 26(5.715,-0.635) 27(4.445,-0.635) 28(3.175,-0.635) 29(1.905,-0.635) 30(0.635,-0.635) 31(-0.635,-0.635) 32(-1.905,-0.635) 33(-3.175,-0.635) 34(-4.445,-0.635) 35(-5.715,-0.635) 36(-6.985,-0.635) 37(-8.255,-0.635) 38(-9.525,-0.635) 39(-10.795,-0.635) 40(-12.065,-0.635) 41(12.065,0.635) 42(10.795,0.635) 43(9.525,0.635) 44(8.255,0.635) 45(6.985,0.635) 46(5.715,0.635) 47(4.445,0.635) 48(3.175,0.635) 49(1.905,0.635) 50(0.635,0.635) 51(-0.635,0.635) 52(-1.905,0.635) 53(-3.175,0.635) 54(-4.445,0.635) 55(-5.715,0.635) 56(-6.985,0.635) 57(-8.255,0.635) 58(-9.525,0.635) 59(-10.795,0.635) 60(-12.065,0.635) 61(12.065,1.905) 62(10.795,1.905) 63(9.525,1.905) 64(8.255,1.905) 65(6.985,1.905) 66(5.715,1.905) 67(4.445,1.905) 68(3.175,1.905) 69(1.905,1.905) 70(0.635,1.905) 71(-0.635,1.905) 72(-1.905,1.905) 73(-3.175,1.905) 74(-4.445,1.905) 75(-5.715,1.905) 76(-6.985,1.905) 77(-8.255,1.905) 78(-9.525,1.905) 79(-10.795,1.905) 80(-12.065,1.905)
Top Overlay:
  lines w0.178: -16.002,-2.794 -15.24,-3.556 14.605,-3.556 15.367,-2.794 15.367,-1.905 16.51,-1.905 16.51,1.905 15.367,1.905 15.367,2.794 14.605,3.556 -15.24,3.556 -16.002,2.794 -16.002,-2.794
  text "80" at -12.7,4.064 h0.76
  text "60" at 11.43,4.064 h0.76
  text "20" at -12.7,-4.826 h0.76
  text "1" at 11.938,-4.826 h0.76
Mechanical 13:
  lines w0.254: -34.29,-19.05 -34.29,19.05 34.29,19.05 34.29,-19.05 -34.29,-19.05
Mechanical 15:
  lines w0.254: -1.27,0 1.27,0 0.635,0 ; 0,-0.635 0,0.635 ; -16.51,-3.81 17.145,-3.81 17.145,3.81 -16.51,3.81 -16.51,-3.81
3D body "465572545.stp": height 7.98, standoff -1.34, extent -16.027,-3.505 16.535,3.556

## Murata_LLA219-0_1_MFG [mm]
pads (8):
  rect 0.25x0.475 smd paste+0 mask+0: 1(-0.75,0.537) 2(-0.25,0.537) 3(0.25,0.537) 4(0.75,0.537) 5(0.75,-0.537) 6(0.25,-0.537) 7(-0.25,-0.537) 8(-0.75,-0.537)
Top Overlay:
  circle w0.25: c-0.75,1.325 r0.125
  lines w0.2: -1.25,-0.6 -1.25,0.6 ; 1.25,-0.6 1.25,0.6
Mechanical 10:
  lines w0.2: -1.15,-0.875 1.15,-0.875 1.15,0.875 -1.15,0.875 -1.15,-0.875
Mechanical 12:
  lines w0.2: -1.05,-0.675 1.05,-0.675 1.05,0.675 -1.05,0.675 -1.05,-0.675
Mechanical 15:
  lines w0.1: -0.262,0 0.262,0 ; 0,-0.262 0,0.262
  lines w0.2: -1.15,-0.875 1.15,-0.875 1.15,0.875 -1.15,0.875 -1.15,-0.875
3D body "Cap_Murata_LLA219C70G225MA01L_eec.STEP": height 0.25, standoff 0, extent -1.15,-0.875 1.15,0.875

## Nano-Fit Vertical Header [mm] "Through Hole, 2.50mm Pitch"
height 10
pads (3):
  round 0 hole 1.3 unplated: 0(0,-1.34)
  round 2 hole 1.2: 1(-1.25,0) 2(1.25,0)
Top Overlay:
  lines w0.15: -0.635,-1.905 -3.175,-1.905 -3.175,1.905 3.175,1.905 3.175,-1.905 0.635,-1.905
Mechanical 1:
  lines w0.2: -1,-1.34 1,-1.34 ; 0,-2.27 0,-0.27 ; -3.175,-4.445 3.175,-4.445 3.175,1.905 -3.175,1.905 -3.175,-4.445
3D body "1053091202.stp": height 10.53, standoff -3.18, extent -2.97,-4.6 2.97,1.74